# Altium footprint library nRF52-Intro.PcbLib: 48 footprints (part 3 of 3)
Each footprint in its own frame and in the unit in brackets; x right, y up, seen from the top. Pads: shape width x height; smd on the part's side, far side on the other; paste and mask are expansions set on the pad; w line width, h text height; cw(c..) or ccw(c..) is an arc to the next point about the centre after c.
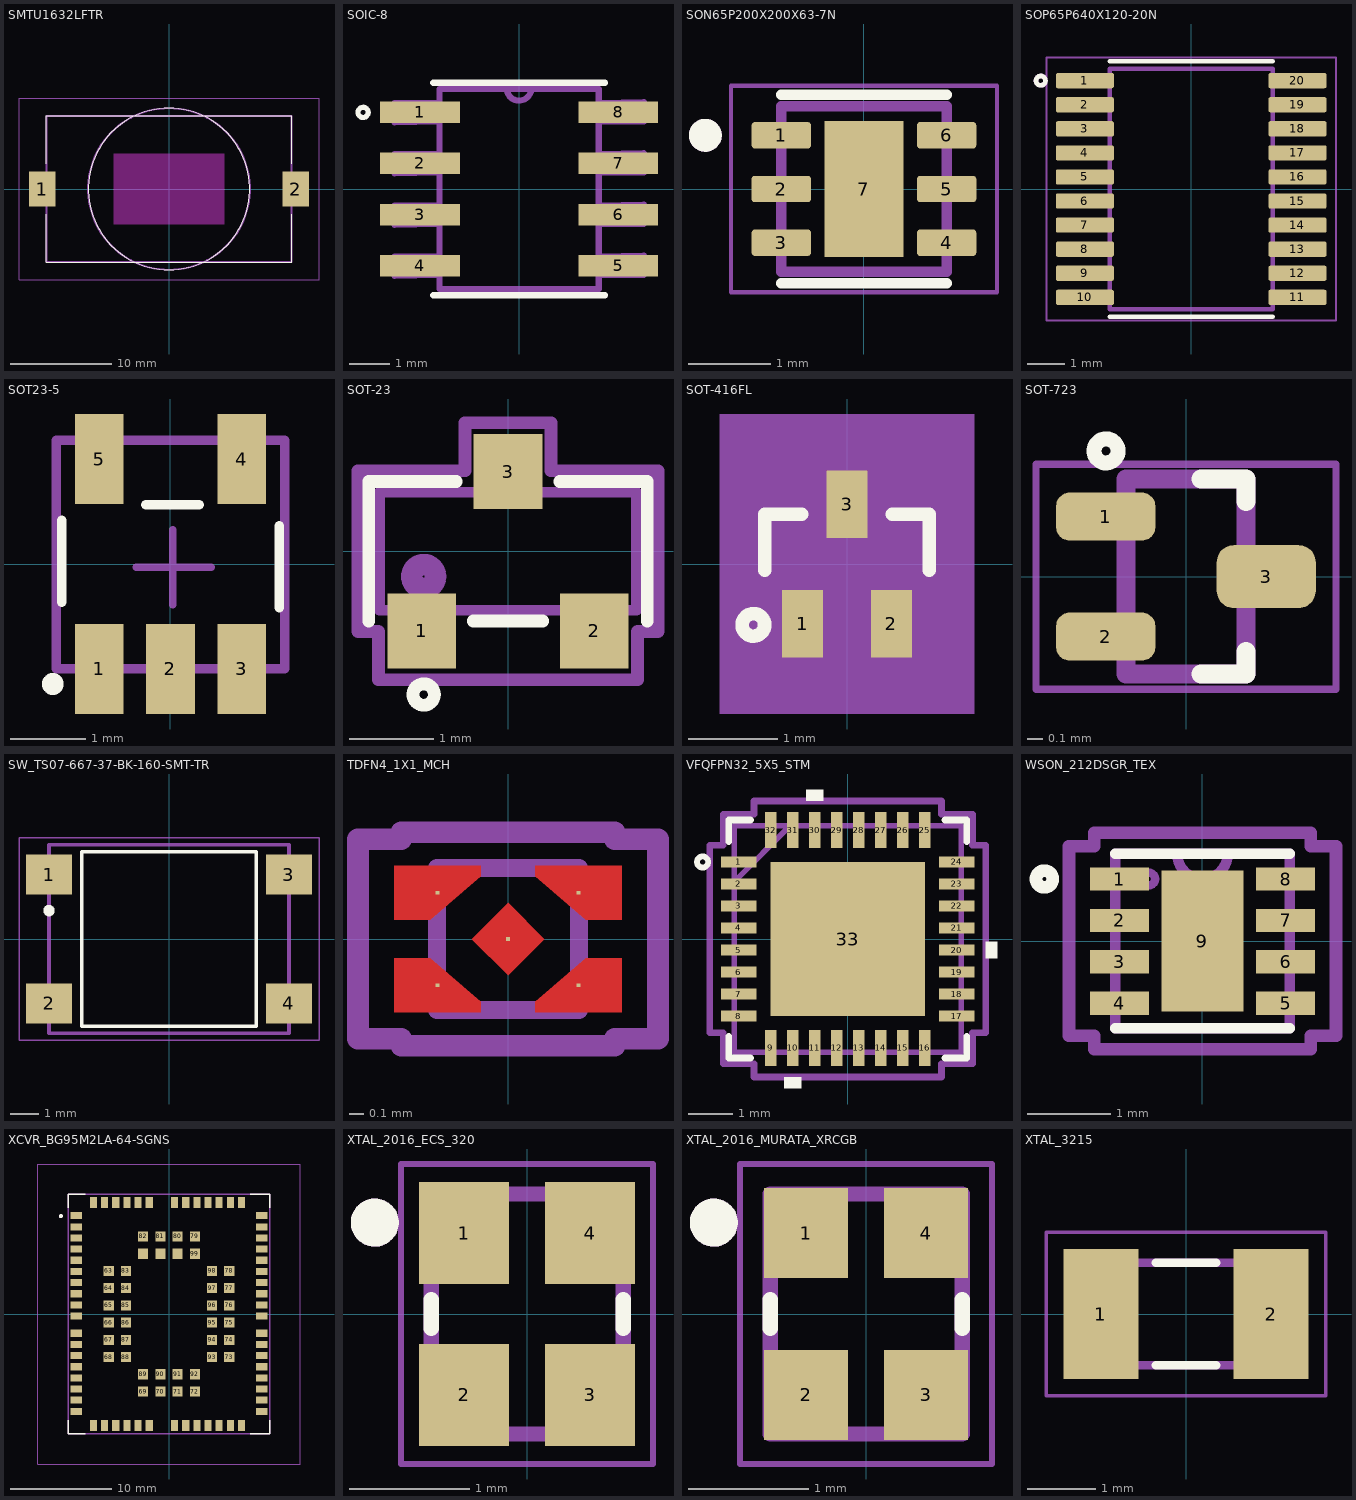
[diagram p2: the footprints below, top view; thin cyan lines are the x and y axes]

## SMTU1632LFTR [mm]
pads (2):
  rect 2.6x3.5 smd: 1(-12.55,0) 2(12.55,0)
Top Layer keep-out:
  rectangle: -5.5,-3.5 5.5,3.5
Top Overlay:
  lines w0.1: -12.15,-2.5 -12.15,-7.25 12.15,-7.25 12.15,-2.5 ; -12.15,2.5 -12.15,7.25 12.15,7.25 12.15,2.5 ; 0,-8 cw(c0,0) 0,8 cw(c0,0) 0,-8
Top Assembly:
  lines w0.2: -12.15,-7.25 12.15,-7.25 12.15,7.25 -12.15,7.25 -12.15,-7.25 ; 0,-8 cw(c0,0) 0,8 cw(c0,0) 0,-8
  text ".designator" at -1.603,-0.527 h1.02
Top Courtyard:
  lines w0.1: -14.85,-9 14.85,-9 14.85,9 -14.85,9 -14.85,-9

## SOIC-8 [mil]
pads (8):
  rect 78x21 smd: 1(-97,75) 2(-97,25) 3(-97,-25) 4(-97,-75) 5(97,-75) 6(97,-25) 7(97,25) 8(97,75)
Top Overlay:
  circle w5: c-152.67,75 r5
  lines w6: -84,-104 84,-104 ; -84,104 84,104
Top Assembly:
  lines w6: -12,98.08 ccw(c0,98.5) 12,98.92 ; -122,-85 -78,-84 -78,-66 -122,-66 -122,-85 ; -122,-35 -78,-34 -78,-16 -122,-16 -122,-35 ; -122,15 -78,16 -78,34 -122,34 -122,15 ; -122,65 -78,66 -78,84 -122,84 -122,65 ; -78,-98 -78,98 -12,98 78,98 78,-98 -78,-98 ; 78,-84 122,-84 122,-65 78,-66 78,-84 ; 78,-34 122,-34 122,-15 78,-16 78,-34 ; 78,16 122,16 122,35 78,34 78,16 ; 78,66 122,66 122,85 78,84 78,66
  text ".Designator" at -29.11,-17.53 h60
3D body "LT1678CS8#TRPBF.STEP": height 69, standoff 0, extent -118,-96.5 118,96.5

## SON65P200X200X63-7N [mm]
pads (7):
  rrect25% 0.72x0.32 smd mask+0.05: 1(-1,0.65) 2(-1,0) 3(-1,-0.65) 4(1,-0.65) 5(1,0) 6(1,0.65)
  rect 0.96x1.65 smd paste-0.18 mask+0.05: 7(0,0)
Top Overlay:
  circle w0.2: c-1.92,0.65 r0.1
  lines w0.127: -1,-1.139 1,-1.139 ; -1,1.139 1,1.139
Top Assembly:
  circle w0.2: c-1.92,0.65 r0.1
  lines w0.127: -1,-1 1,-1 1,1 -1,1 -1,-1
  text ".Designator" at -0.238,-0.333 h1.27
Top Courtyard:
  lines w0.05: -1.61,-1.25 1.61,-1.25 1.61,1.25 -1.61,1.25 -1.61,-1.25
3D body "step_temp.STEP": height 0.63, standoff 0, extent -1,-1 1,1

## SOP65P640X120-20N [mm]
pads (20):
  rrect25% 1.57x0.41 smd mask+0.051: 1(-2.87,2.925) 2(-2.87,2.275) 3(-2.87,1.625) 4(-2.87,0.975) 5(-2.87,0.325) 6(-2.87,-0.325) 7(-2.87,-0.975) 8(-2.87,-1.625) 9(-2.87,-2.275) 10(-2.87,-2.925) 11(2.87,-2.925) 12(2.87,-2.275) 13(2.87,-1.625) 14(2.87,-0.975) 15(2.87,-0.325) 16(2.87,0.325) 17(2.87,0.975) 18(2.87,1.625) 19(2.87,2.275) 20(2.87,2.925)
Top Overlay:
  circle w0.127: c-4.063,2.925 r0.127
  lines w0.127: -2.2,-3.45 2.2,-3.45 ; -2.2,3.45 2.2,3.45
Top Assembly:
  circle w0.127: c-4.063,2.925 r0.127
  lines w0.127: -2.2,-3.25 -2.2,3.25 2.2,3.25 2.2,-3.25 -2.2,-3.25
  text ".Designator" at -0.32,-0.309 h1.27
Top Courtyard:
  lines w0.05: -3.91,-3.55 -3.91,3.55 3.91,3.55 3.91,-3.55 -3.91,-3.55
3D body "TXS0108EPWR.STEP": height 1.2, standoff 0, extent -3.2,-3.25 3.2,3.25

## SOT23-5 [mm]
pads (5):
  rect 0.65x1.2 smd mask+0.05: 1(-0.95,-1.4) 2(0,-1.4) 3(0.95,-1.4) 4(0.95,1.4) 5(-0.95,1.4)
Top Overlay:
  circle w0.25: c-1.57,-1.6 r0.02
  lines w0.127: -1.448,-0.508 -1.448,0.584 ; -0.33,0.787 0.381,0.787 ; 1.448,-0.584 1.448,0.508
Top Assembly:
  lines w0.127: -1.524,-1.397 1.524,-1.397 1.524,1.651 -1.524,1.651 -1.524,-1.397
  text ".Designator" at -0.666,-0.253 h1.27
Top Courtyard:
  lines w0.1: -0.457,-0.045 0.543,-0.045 ; 0.033,-0.545 0.033,0.455
3D body "User Library-SOT-23-5.STEP": height 1.4, standoff -0.06, extent -1.48,-1.41 1.52,1.59

## SOT-23 [mil]
pads (3):
  rect 32x35 smd paste+0 mask+0: 1(-40.35,-37.2) 2(40.35,-37.2) 3(0,37.2)
Top Overlay:
  circle w6: c-39.37,-66.93 r5
  lines w6: -65.04,-32.56 -65.04,32.56 -24.14,32.56 ; -16.21,-32.56 16.21,-32.56 ; 24.14,32.56 65.04,32.56 65.04,-32.56
Top Assembly:
  circle w10: c-39.37,-11.81 r5.57
  lines w1: -50.39,-27.56 -30.32,-27.56 ; -10.04,27.56 10.04,27.56 ; 30.32,-27.56 50.39,-27.56
  lines w5: -50.39,-27.56 -50.39,-49.21 -30.32,-49.21 -30.32,-27.56 ; -10.04,27.56 -10.04,49.21 10.04,49.21 10.04,27.56 ; 30.32,-27.56 30.32,-49.21 50.39,-49.21 50.39,-27.56 ; -60.04,-27.56 -60.04,27.56 60.04,27.56 60.04,-27.56 -60.04,-27.56
  text ".Designator" at -4.38,-17.74 h60
Top Courtyard:
  lines w6: -60.39,-60 -60.39,-37.56 -70.04,-37.56 -70.04,37.56 -20.04,37.56 -20,60 ; -60,-60 60,-60 ; -20.04,60 20.04,60 20.04,37.56 70.04,37.56 70.04,-37.56 60.39,-37.56 60.39,-60
3D body "SC-74-3.stp": height 44.88, standoff 1.38, extent -57.09,-51.19 57.08,51.18

## SOT-416FL [mil]
pads (3):
  rect 18.11x30 smd paste+0 mask+0: 1(-19.68,-26.5) 2(19.68,-26.5) 3(0,26.5)
Top Overlay:
  circle w6: c-41.5,-27 r5
  lines w6: -36.5,-2.82 -36.5,22 -20.1,22 ; 20.1,22 36.5,22 36.5,-2.82
Mechanical 5:
  region: -56.5,66.5 56.5,66.5 56.5,-66.5 -56.5,-66.5
Top Assembly:
  lines w5: -31.5,-17 31.5,-17 31.5,17 -31.5,17 -31.5,-17 ; -26.68,-33.5 -26.68,-17 -12.69,-17 -12.69,-33.5 -26.68,-33.5 ; -7,17 7,17 7,33.5 -7,33.5 -7,17 ; 12.69,-33.5 12.69,-17 26.68,-17 26.68,-33.5 12.69,-33.5
  text ".Designator" at -15.01,-14.63 h60
Top Courtyard:
  region: 31.5,-17 -31.5,-17 -31.5,17 31.5,17
  lines w6: -41.5,-27 -41.5,27 -17,27 -17,51.5 17,51.5 17,27 41.5,27 41.5,-27 36.69,-27 36.69,-51.5 -36.69,-51.5 -36.69,-27 -41.5,-27
3D body "TRANS_2SC4617EB_ROM.step": height 35.12, standoff 0, extent -31.5,-33.5 31.5,33.5

## SOT-723 [mm]
pads (3):
  rrect54% 0.66x0.32 smd mask+0.05: 1(-0.535,0.4) 2(-0.535,-0.4)
  rrect54% 0.66x0.42 smd mask+0.05: 3(0.535,0)
Top Overlay:
  circle w0.1: c-0.533,0.838 r0.08
  lines w0.127: 0.1,-0.65 0.4,-0.65 0.4,-0.5 ; 0.1,0.65 0.4,0.65 0.4,0.5
Top Assembly:
  lines w0.127: -0.4,-0.65 -0.4,0.65 0.4,0.65 0.4,-0.65 -0.4,-0.65
  text ".Designator" at -0.035,-0.585 h1.52
Top Courtyard:
  lines w0.05: -1,-0.75 -1,0.75 1,0.75 1,-0.75 -1,-0.75
3D body "RUM001L02T2CL.STEP": height 0.55, standoff 0, extent -0.6,-0.6 0.6,0.6

## SW_TS07-667-37-BK-160-SMT-TR [mm]
height 2.7
pads (4):
  rect 1.6x1.4 smd: 1(-4.2,2.25) 2(-4.2,-2.25) 3(4.2,2.25) 4(4.2,-2.25)
Top Overlay:
  circle w0.2: c-4.2,0.995 r0.1
  lines w0.127: -3.05,-3.05 -3.05,3.05 3.05,3.05 3.05,-3.05 -3.05,-3.05
Top Assembly:
  circle w0.2: c-3.63,2.25 r0.1
  lines w0.127: -4.2,-3.3 4.2,-3.3 4.2,3.3 -4.2,3.3 -4.2,-3.3
  text ".Designator" at -0.435,-0.389 h1.52
Top Courtyard:
  lines w0.05: -5.25,-3.55 5.25,-3.55 5.25,3.55 -5.25,3.55 -5.25,-3.55
3D body "CUI_DEVICES_TS07-667-37-BK-160-SMT-TR.step": height 3.7, standoff -0.1, extent -4.2,-3.3 4.2,3.3

## TDFN4_1X1_MCH [mil]
pads (5):
  rect 1x1 smd paste+0 mask+0: 1(-19.5,12.8) 2(-19.5,-12.8) 3(19.5,-12.8) 4(19.5,12.8) 5(0,0)
Top Layer:
  region: 10,0 0,10 -10,0 0,-10
  region: 7.5,20.3 31.5,20.3 31.5,5.3 21.5,5.3 7.5,17.3
  region: 21.5,-5.3 31.5,-5.3 31.5,-20.3 7.5,-20.3 7.5,-17.3
  region: -21.5,-5.3 -31.5,-5.3 -31.5,-20.3 -7.5,-20.3 -7.5,-17.3
  region: -7.5,20.3 -31.5,20.3 -31.5,5.3 -21.5,5.3 -7.5,17.3
Top Paste:
  region: 10,0 0,10 -10,0 0,-10
  region: 7.5,20.3 31.5,20.3 31.5,5.3 21.5,5.3 7.5,17.3
  region: 21.5,-5.3 31.5,-5.3 31.5,-20.3 7.5,-20.3 7.5,-17.3
  region: -21.5,-5.3 -31.5,-5.3 -31.5,-20.3 -7.5,-20.3 -7.5,-17.3
  region: -7.5,20.3 -31.5,20.3 -31.5,5.3 -21.5,5.3 -7.5,17.3
Top Solder:
  region: 10,0 0,10 -10,0 0,-10
  region: 7.5,20.3 31.5,20.3 31.5,5.3 21.5,5.3 7.5,17.3
  region: 21.5,-5.3 31.5,-5.3 31.5,-20.3 7.5,-20.3 7.5,-17.3
  region: -21.5,-5.3 -31.5,-5.3 -31.5,-20.3 -7.5,-20.3 -7.5,-17.3
  region: -7.5,20.3 -31.5,20.3 -31.5,5.3 -21.5,5.3 -7.5,17.3
Top Assembly:
  lines w5: -19.68,-19.68 -19.68,19.68 19.68,19.68 19.68,-19.68 -19.68,-19.68
Top Courtyard:
  lines w6: -41.5,-27.59 -29.5,-27.59 -29.5,-29.5 29.5,-29.5 29.5,-27.59 41.5,-27.59 41.5,27.59 29.5,27.59 29.5,29.5 -29.5,29.5 -29.5,27.59 -41.5,27.59 -41.5,-27.59
3D body: height 23.62, standoff 0, extent -19.68,-19.68 19.68,19.68

## VFQFPN32_5X5_STM [mil]
pads (33):
  rect 32x10 smd paste+0 mask+0: 1(-97.5,68.9) 2(-97.5,49.21) 3(-97.5,29.53) 4(-97.5,9.84) 5(-97.5,-9.84) 6(-97.5,-29.53) 7(-97.5,-49.21) 8(-97.5,-68.9) 17(97.5,-68.9) 18(97.5,-49.21) 19(97.5,-29.53) 20(97.5,-9.84) 21(97.5,9.84) 22(97.5,29.53) 23(97.5,49.21) 24(97.5,68.9)
  rect 10x32 smd paste+0 mask+0: 9(-68.9,-97.5) 10(-49.21,-97.5) 11(-29.53,-97.5) 12(-9.84,-97.5) 13(9.84,-97.5) 14(29.53,-97.5) 15(49.21,-97.5) 16(68.9,-97.5) 25(68.9,97.5) 26(49.21,97.5) 27(29.53,97.5) 28(9.84,97.5) 29(-9.84,97.5) 30(-29.53,97.5) 31(-49.21,97.5) 32(-68.9,97.5)
  rect 138x138 smd paste-68.5 mask+0: 33(0,0)
Top Overlay:
  circle w5: c-129.92,68.9 r5
  region: -41.71,-123.5 -56.71,-123.5 -56.71,-133.5 -41.71,-133.5
  region: 123.5,-2.34 133.5,-2.34 133.5,-17.34 123.5,-17.34
  region: -22.03,123.5 -37.03,123.5 -37.03,133.5 -22.03,133.5
  lines w6: -106.5,-87 -106.5,-106.5 -87,-106.5 ; -106.5,87 -106.5,106.5 -87,106.5 ; 87,-106.5 106.5,-106.5 106.5,-87 ; 87,106.5 106.5,106.5 106.5,87
Top Paste:
  region: -3.94,65.06 -65.06,65.06 -65.06,3.94 -3.94,3.94
  region: -3.94,-3.94 -65.06,-3.94 -65.06,-65.06 -3.94,-65.06
  region: 65.06,65.06 3.94,65.06 3.94,3.94 65.06,3.94
  region: 65.06,-3.94 3.94,-3.94 3.94,-65.06 65.06,-65.06
Top Assembly:
  lines w5: -101.5,51.5 -51.5,101.5 ; -101.5,-101.5 101.5,-101.5 101.5,101.5 -101.5,101.5 -101.5,-101.5
  text ".Designator" at -45.36,-19.19 h40
Top Courtyard:
  lines w6: -123.5,-83.9 -111.5,-83.9 -111.5,-111.5 -83.9,-111.5 -83.9,-123.5 83.9,-123.5 83.9,-111.5 111.5,-111.5 111.5,-83.9 123.5,-83.9 123.5,83.9 111.5,83.9 111.5,111.5 83.9,111.5 83.9,123.5 -83.9,123.5 -83.9,111.5 -111.5,111.5 -111.5,83.9 -123.5,83.9 -123.5,-83.9
3D body "VFQFPN32_5X5_STM.step": height 39.09, standoff 0, extent -101.5,-101.5 101.5,101.5

## WSON_212DSGR_TEX [mil]
pads (9):
  rect 28x11 smd paste+0 mask+0: 1(-39.5,29.54) 2(-39.5,9.85) 3(-39.5,-9.85) 4(-39.5,-29.54) 5(39.5,-29.54) 6(39.5,-9.85) 7(39.5,9.85) 8(39.5,29.54)
  rect 39x67 smd paste+0 mask+0: 9(0,0)
Top Overlay:
  circle w6: c-75.19,29.54 r4
  lines w5: -41.5,-41.49 41.5,-41.49 ; -41.5,41.5 41.5,41.5
Top Assembly:
  circle w3.94: c-25.5,29.54 r3
  lines w5: -12,41.5 ccw(c0,41.5) 12,41.5 ; -41.5,-41.5 41.5,-41.5 41.5,41.5 -41.5,41.5 -41.5,-41.5
  text ".Designator" at -32.45,-23.58 h60
Top Courtyard:
  lines w6: -63.5,-45.03 -63.5,45.03 -51.5,45.03 -51.5,51.5 51.5,51.5 51.5,45.03 63.5,45.03 63.5,-45.03 51.5,-45.03 51.5,-51.5 -51.5,-51.5 -51.5,-45.03 -63.5,-45.03
3D body "WSON_212DSGR_TEX.step": height 32.09, standoff 0, extent -41.5,-41.5 41.5,41.5

## XCVR_BG95M2LA-64-SGNS [mm]
pads (102):
  rect 1.1x0.7 smd paste-2: 1(-9.15,9.7) 2(-9.15,8.6) 3(-9.15,7.5) 4(-9.15,6.4) 5(-9.15,5.3) 6(-9.15,4.2) 7(-9.15,3.1) 8(-9.15,2) 9(-9.15,0.9) 10(-9.15,-0.2) 11(-9.15,-1.9) 12(-9.15,-3) 13(-9.15,-4.1) 14(-9.15,-5.2) 15(-9.15,-6.3) 16(-9.15,-7.4) 17(-9.15,-8.5) 18(-9.15,-9.6) 32(9.15,-9.6) 33(9.15,-8.5) 34(9.15,-7.4) 35(9.15,-6.3) 36(9.15,-5.2) 37(9.15,-4.1) 38(9.15,-3) 39(9.15,-1.9) 40(9.15,-0.2) 41(9.15,0.9) 42(9.15,2) 43(9.15,3.1) 44(9.15,4.2) 45(9.15,5.3) 46(9.15,6.4) 47(9.15,7.5) 48(9.15,8.6) 49(9.15,9.7)
  rect 0.7x1.1 smd paste-2: 19(-7.45,-11) 20(-6.35,-11) 21(-5.25,-11) 22(-4.15,-11) 23(-3.05,-11) 24(-1.95,-11) 25(0.55,-11) 26(1.65,-11) 27(2.75,-11) 28(3.85,-11) 29(4.95,-11) 30(6.05,-11) 31(7.15,-11) 50(7.15,11) 51(6.05,11) 52(4.95,11) 53(3.85,11) 54(2.75,11) 55(1.65,11) 56(0.55,11) 57(-1.95,11) 58(-3.05,11) 59(-4.15,11) 60(-5.25,11) 61(-6.35,11) 62(-7.45,11)
  rect 1x1 smd paste-1: 63(-5.95,4.25) 64(-5.95,2.55) 65(-5.95,0.85) 66(-5.95,-0.85) 67(-5.95,-2.55) 68(-5.95,-4.25) 69(-2.55,-7.65) 70(-0.85,-7.65) 71(0.85,-7.65) 72(2.55,-7.65) 73(5.95,-4.25) 74(5.95,-2.55) 75(5.95,-0.85) 76(5.95,0.85) 77(5.95,2.55) 78(5.95,4.25) 79(2.55,7.65) 80(0.85,7.65) 81(-0.85,7.65) 82(-2.55,7.65) 83(-4.25,4.25) 84(-4.25,2.55) 85(-4.25,0.85) 86(-4.25,-0.85) 87(-4.25,-2.55) 88(-4.25,-4.25) 89(-2.55,-5.95) 90(-0.85,-5.95) 91(0.85,-5.95) 92(2.55,-5.95) 93(4.25,-4.25) 94(4.25,-2.55) 95(4.25,-0.85) 96(4.25,0.85) 97(4.25,2.55) 98(4.25,4.25) 99(2.55,5.95) 100(0.85,5.95) 101(-0.85,5.95) 102(-2.55,5.95)
Top Overlay:
  circle w0.2: c-10.67,9.66 r0.1
  lines w0.127: -9.95,-10.5 -9.95,-11.8 -8.25,-11.8 ; -9.95,10.5 -9.95,11.8 -8.25,11.8 ; 8,-11.8 9.95,-11.8 9.95,-10.5 ; 8,11.8 9.95,11.8 9.95,10.5
Top Paste:
  drawing of 102 lines, arcs and shapes, not listed
Top Assembly:
  circle w0.2: c-10.67,9.66 r0.1
  lines w0.127: -9.95,-11.8 9.95,-11.8 9.95,11.8 -9.95,11.8 -9.95,-11.8
  text ".Designator" at -0.292,-0.458 h1.52
Top Courtyard:
  lines w0.05: -12.95,-14.8 -12.95,14.8 12.95,14.8 12.95,-14.8 -12.95,-14.8
3D body "step_temp.STEP": height 2.4, standoff 0, extent -9.95,-11.8 9.95,11.8

## XTAL_2016_ECS_320 [mm]
pads (4):
  rect 0.75x0.85 smd mask+0.051: 1(-0.525,0.675) 2(-0.525,-0.675) 3(0.525,-0.675) 4(0.525,0.675)
Top Overlay:
  circle w0.2: c-1.27,0.762 r0.1
  lines w0.127: -0.8,-0.12 -0.8,0.12 ; 0.8,-0.12 0.8,0.12
Top Assembly:
  circle w0.2: c-1.27,0.762 r0.1
  lines w0.127: -0.8,-1 0.8,-1 0.8,1 -0.8,1 -0.8,-1
  text ".designator" at -0.328,-0.201 h0.76
Top Courtyard:
  lines w0.05: -1.05,-1.25 1.05,-1.25 1.05,1.25 -1.05,1.25 -1.05,-1.25
3D body "ECS-320-8-37B-CKY-TR.STEP": height 0.5, standoff 0, extent -0.8,-1 0.8,1

## XTAL_2016_MURATA_XRCGB [mm]
pads (4):
  rect 0.7x0.75 smd mask+0.051: 1(-0.5,0.675) 2(-0.5,-0.675) 3(0.5,-0.675) 4(0.5,0.675)
Top Overlay:
  circle w0.2: c-1.27,0.762 r0.1
  lines w0.127: -0.8,-0.12 -0.8,0.12 ; 0.8,-0.12 0.8,0.12
Top Assembly:
  circle w0.2: c-1.27,0.762 r0.1
  lines w0.127: -0.8,-1 -0.8,1 0.8,1 0.8,-1 -0.8,-1
  text ".designator" at -0.328,-0.201 h0.76
Top Courtyard:
  lines w0.05: -1.05,-1.25 -1.05,1.25 1.05,1.25 1.05,-1.25 -1.05,-1.25
3D body "step_temp.STEP": height 0.7, standoff 0, extent -0.8,-1 0.8,1

## XTAL_3215 [mm]
pads (2):
  rect 1.1x1.9 smd: 1(-1.25,0) 2(1.25,0)
Top Overlay:
  lines w0.127: -0.44,-0.75 0.44,-0.75 ; -0.44,0.75 0.44,0.75
Top Assembly:
  lines w0.127: -1.6,-0.75 -1.6,0.75 ; -1.6,-0.75 1.6,-0.75 ; -1.6,-0.75 -1.6,0.75 ; -1.6,-0.75 1.6,-0.75 ; -1.6,0.75 1.6,0.75 ; -1.6,0.75 1.6,0.75 ; 1.6,-0.75 1.6,0.75 ; 1.6,-0.75 1.6,0.75
  text ".designator" at -0.5,-0.358 h0.76
Top Courtyard:
  lines w0.05: -2.05,-1.2 2.05,-1.2 2.05,1.2 -2.05,1.2 -2.05,-1.2
3D body "User Library-ECX-34R.STEP": height 0.89, standoff 0, extent -1.6,-0.75 1.6,0.75